# Altium footprint library LIBRARIE_EMILE.PcbLib: 35 footprints (part 1 of 3)
Each footprint in its own frame and in the unit in brackets; x right, y up, seen from the top. Pads: shape width x height; smd on the part's side, far side on the other; paste and mask are expansions set on the pad; w line width, h text height; cw(c..) or ccw(c..) is an arc to the next point about the centre after c.
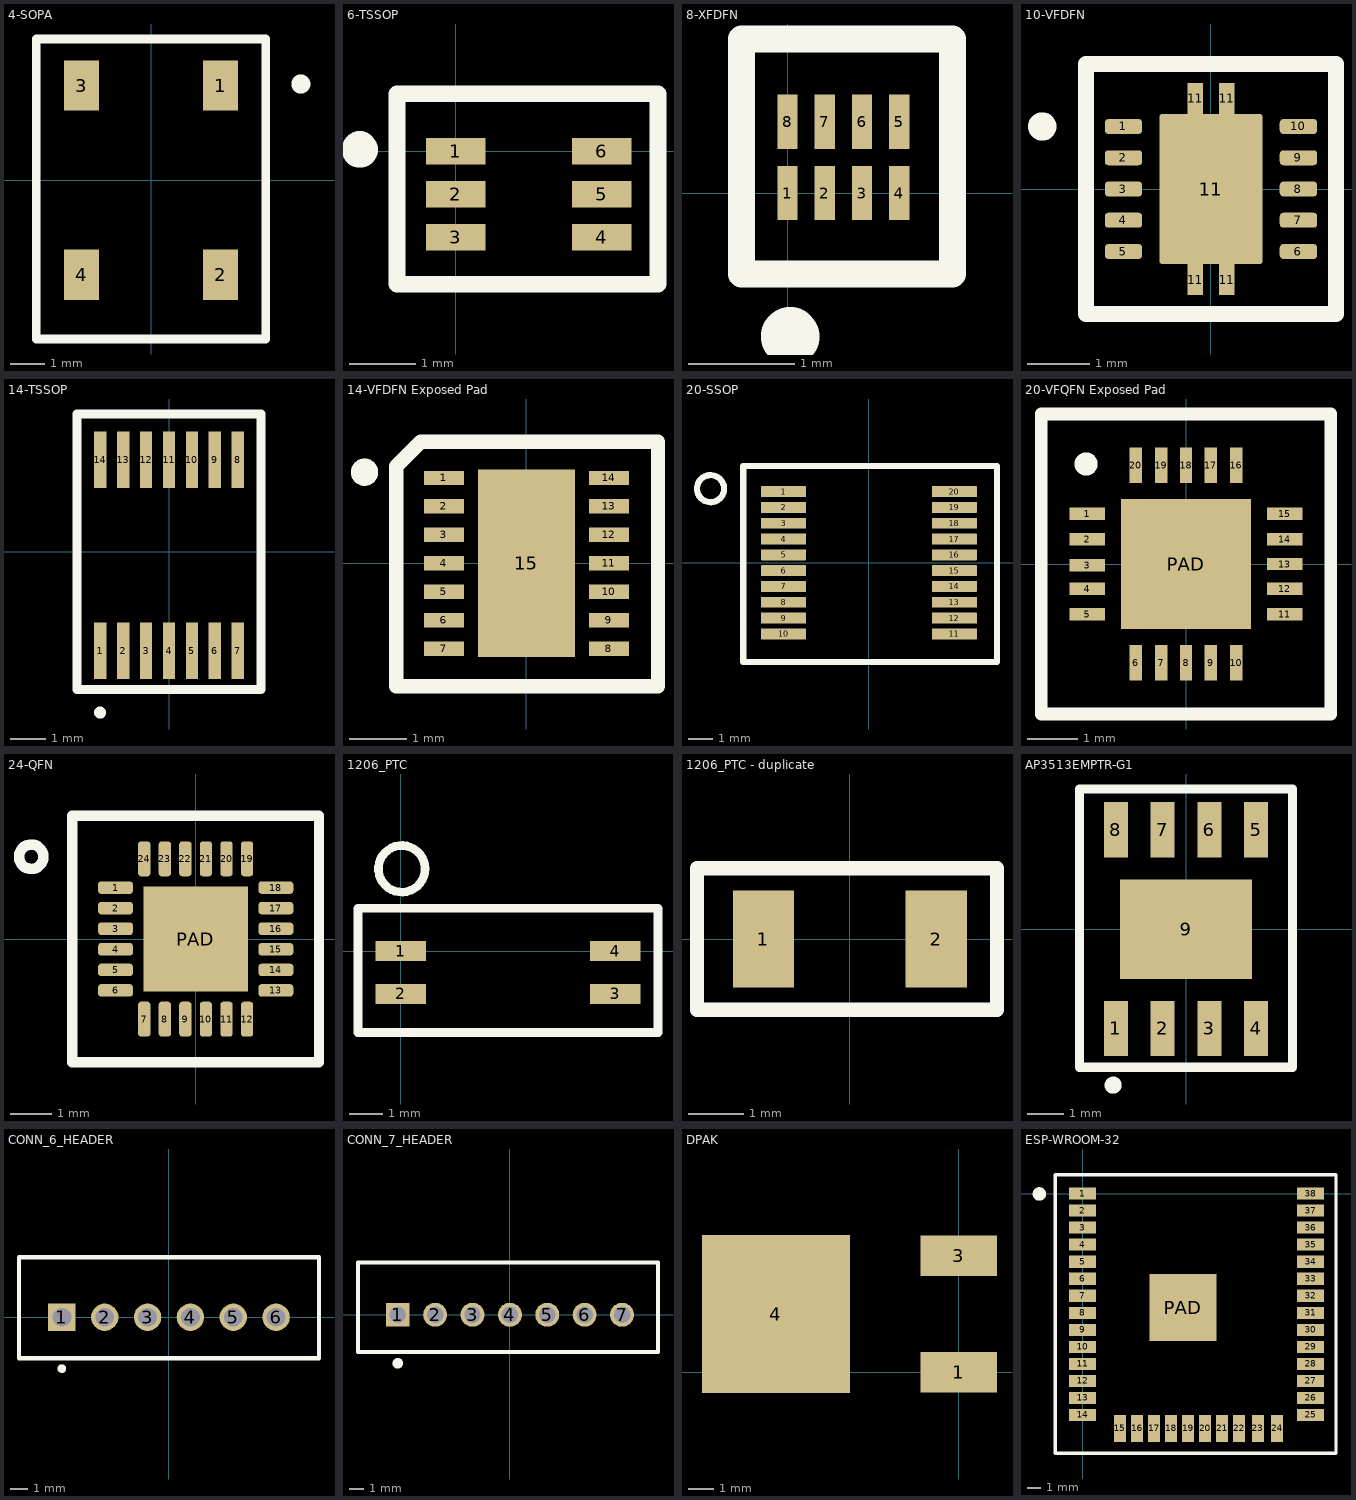
[diagram p0: the footprints below, top view; thin cyan lines are the x and y axes]

## 4-SOPA [mm]
pads (4):
  rect 1x1.45 smd: 1(2,2.725) 2(2,-2.725) 3(-2,2.725) 4(-2,-2.725)
Top Overlay:
  lines w0.254: -3.302,-4.572 3.302,-4.572 3.302,4.064 -3.302,4.064 -3.302,-4.572
  lines w0.5: 4.329,2.788 ccw(c4.312,2.77) 4.337,2.77
3D body "User Library-SOP-4.step": height 1.02, standoff -1.02, extent -2,-3.43 2,3.43

## 6-TSSOP [mm]
pads (6):
  rect 0.9x0.4 smd paste-0.025 mask+0.05: 1(0,0) 2(0,-0.65) 3(0,-1.3) 4(2.2,-1.3) 5(2.2,-0.65) 6(2.2,0)
Top Overlay:
  lines w0.254: -0.889,-2.007 -0.889,0.864 3.048,0.864 3.048,-2.007 -0.889,-2.007
  lines w0.5: -1.444,0.049 ccw(c-1.45,0.025) -1.425,0.025
3D body "6-TSSOP.step": height 1.1, standoff 0, extent -0.033,-1.635 2.167,0.365

## 8-XFDFN [mm]
pads (8):
  rect 0.19x0.508 smd paste-0.025 mask+0.05: 1(0,0) 2(0.35,0) 3(0.7,0) 4(1.05,0) 5(1.05,0.67) 6(0.7,0.67) 7(0.35,0.67) 8(0,0.67)
Top Overlay:
  lines w0.254: -0.432,-0.762 1.549,-0.762 1.549,1.448 -0.432,1.448 -0.432,-0.762
  lines w0.5: 0.032,-1.322 ccw(c0.025,-1.346) 0.05,-1.346
3D body "DQE8.step": height 0.13, standoff 0, extent -0.19,-0.242 1.258,0.902

## 10-VFDFN [mm]
pads (15):
  rrect50% 0.6x0.24 smd paste-0.025 mask+0.05: 1(-1.4,1) 2(-1.4,0.5) 3(-1.4,0) 4(-1.4,-0.5) 5(-1.4,-1) 6(1.4,-1) 7(1.4,-0.5) 8(1.4,0) 9(1.4,0.5) 10(1.4,1)
  rrect5% 0.25x0.5 smd paste-0.025 mask+0.05: 11(-0.25,-1.45) 11(-0.25,1.45) 11(0.25,-1.45) 11(0.25,1.45)
  rrect5% 1.65x2.4 smd paste-0.025 mask+0.05: 11(0,0)
Top Overlay:
  circle w0.254: c-2.7,1 r0.1
  lines w0.254: -2,-2 -2,2 2,2 2,-2 -2,-2
3D body "10-VFDFN.step": height 1, standoff 0, extent -1.56,-1.562 1.56,1.562

## 14-TSSOP [mm]
pads (14):
  rect 0.35x1.6 smd paste+0 mask+0.05: 1(-1.95,-2.8) 2(-1.3,-2.8) 3(-0.65,-2.8) 4(0,-2.8) 5(0.65,-2.8) 6(1.3,-2.8) 7(1.95,-2.8) 8(1.95,2.6) 9(1.3,2.6) 10(0.65,2.6) 11(0,2.6) 12(-0.65,2.6) 13(-1.3,2.6) 14(-1.95,2.6)
Top Overlay:
  circle w0.254: c-1.95,-4.55 r0.041
  lines w0.254: -2.6,-3.9 2.6,-3.9 2.6,3.9 -2.6,3.9 -2.6,-3.9
3D body "User Library-tssop14-2.step": height 1.2, standoff 0, extent -2.55,-3.2 2.55,3.2

## 14-VFDFN Exposed Pad [mm]
pads (15):
  rect 0.7x0.25 smd paste-0.025 mask+0.07: 1(-1.45,1.5) 2(-1.45,1) 3(-1.45,0.5) 4(-1.45,0) 5(-1.45,-0.5) 6(-1.45,-1) 7(-1.45,-1.5) 8(1.45,-1.5) 9(1.45,-1) 10(1.45,-0.5) 11(1.45,0) 12(1.45,0.5) 13(1.45,1) 14(1.45,1.5)
  rect 1.7x3.3 smd paste-0.025 mask+0.07: 15(0,0)
Top Overlay:
  circle w0.254: c-2.845,1.6 r0.114
  lines w0.254: -2.286,-2.159 -2.286,1.702 -1.854,2.134 2.311,2.134 2.311,-2.159 -2.286,-2.159
3D body "DFN-14-1EP_3x4mm_P0.5mm_EP1.7x3.3mm.step": height 0.77, standoff 0, extent -1.5,-1.99 1.5,1.99

## 20-SSOP [mm]
pads (20):
  rrect10% 1.85x0.45 smd paste-0.025 mask+0.05: 1(-3.5,2.925) 2(-3.5,2.275) 3(-3.5,1.625) 4(-3.5,0.975) 5(-3.5,0.325) 6(-3.5,-0.325) 7(-3.5,-0.975) 8(-3.5,-1.625) 9(-3.5,-2.275) 10(-3.5,-2.925) 11(3.53,-2.925) 12(3.53,-2.275) 13(3.53,-1.625) 14(3.53,-0.975) 15(3.53,-0.325) 16(3.53,0.325) 17(3.53,0.975) 18(3.53,1.625) 19(3.53,2.275) 20(3.53,2.925)
Top Overlay:
  circle w0.254: c-6.502,3.048 r0.557
  lines w0.254: -5.156,-4.089 -5.156,3.988 5.283,3.988 5.283,-4.089 -3.531,-4.089 -5.156,-4.089
3D body "User Library-SSOP_20.step": height 1.79, standoff -0.05, extent -3.925,-3.65 3.975,3.65

## 20-VFQFN Exposed Pad [mm] "POE_REG"
pads (21):
  rect 0.7x0.25 smd paste-0.025 mask+0.07: 1(-1.975,1) 2(-1.975,0.5) 3(-1.975,-0.025) 4(-1.975,-0.5) 5(-1.975,-1) 11(1.975,-1) 12(1.975,-0.5) 13(1.975,0) 14(1.975,0.5) 15(1.975,1)
  rect 0.25x0.7 smd paste-0.025 mask+0.07: 6(-1,-1.975) 7(-0.5,-1.975) 8(0,-1.975) 9(0.5,-1.975) 10(1,-1.975) 16(1,1.975) 17(0.5,1.975) 18(0,1.975) 19(-0.5,1.975) 20(-1,1.975)
  rect 2.6x2.6 smd paste-0.025 mask+0.07: PAD(0,0)
Top Overlay:
  circle w0.254: c-2,2 r0.105
  lines w0.254: -2.896,-3 -2.896,3 2.896,3 2.896,-3 -2.896,-3
3D body "User Library-QFN20 4x4.step": height 0.72, standoff -0.01, extent -2.025,-2.025 2.025,2.025

## 24-QFN [mm]
pads (25):
  rrect50% 0.85x0.3 smd paste-0.025 mask+0.05: 1(-1.95,1.25) 2(-1.95,0.75) 3(-1.95,0.25) 4(-1.95,-0.25) 5(-1.95,-0.75) 6(-1.95,-1.25)
  rrect50% 0.3x0.85 smd mask+0.05: 7(-1.25,-1.95) 8(-0.75,-1.95) 9(-0.25,-1.95) 10(0.25,-1.95) 11(0.75,-1.95) 12(1.25,-1.95) 19(1.25,1.95) 20(0.75,1.95) 21(0.25,1.95) 22(-0.25,1.95) 23(-0.75,1.95) 24(-1.25,1.95)
  rrect50% 0.85x0.3 smd mask+0.05: 13(1.95,-1.25) 14(1.95,-0.75) 15(1.95,-0.25) 16(1.95,0.25) 17(1.95,0.75) 18(1.95,1.25)
  rect 2.55x2.55 smd mask+0.07: PAD(0,0)
Top Overlay:
  circle w0.254: c-4,2 r0.297
  lines w0.254: -3,-3 3,-3 3,3 -3,3 -3,-3
3D body "User Library-QFN 24 4x4.step": height 0.9, standoff 0, extent -2.004,-2 2,2.004

## 1206_PTC [mm]
pads (4):
  rect 1.5x0.6 smd paste+0.025 mask+0.07: 1(0,0) 2(0,-1.27) 3(6.35,-1.27) 4(6.35,0)
Top Overlay:
  circle w0.254: c0.025,2.438 r0.691
  lines w0.254: -1.27,-2.413 7.62,-2.413 7.62,1.27 -1.27,1.27 -1.27,-2.413
3D body "User Library-ACPL-217-56DE.step": height 2.01, standoff -0.12, extent -0.325,-1.956 6.675,0.644

## 1206_PTC - duplicate [mm]
pads (2):
  rect 1.1x1.75 smd paste+0.025 mask+0.07: 1(-1.55,0) 2(1.55,0)
Top Overlay:
  lines w0.254: -2.743,-1.27 2.642,-1.27 2.642,1.27 -2.743,1.27 -2.743,-1.27
3D body "User Library-nona SMD075F.step": height 0.56, standoff 0, extent -1.525,-0.8 1.677,0.852

## AP3513EMPTR-G1 [mm] "SW REG"
pads (9):
  rect 0.65x1.5 smd paste-0.025 mask+0.07: 1(-1.905,-2.7) 2(-0.635,-2.7) 3(0.635,-2.7) 4(1.905,-2.7) 5(1.905,2.7) 6(0.635,2.7) 7(-0.635,2.7) 8(-1.905,2.7)
  rect 3.6x2.7 smd paste-0.025 mask+0.07: 9(0,0)
Top Overlay:
  circle w0.254: c-1.981,-4.242 r0.105
  lines w0.254: -2.896,-3.759 2.896,-3.759 2.896,3.81 -2.896,3.81 -2.896,-3.759
3D body "SO-8.step": height 1.7, standoff 0, extent -2.45,-3 2.45,3

## CONN_6_HEADER [mm]
pads (6):
  rect 1.6x1.6 hole 1.1: 1(-6.25,0)
  round 1.6 hole 1.1: 2(-3.75,0) 3(-1.25,0) 4(1.25,0) 5(3.75,0) 6(6.25,0)
Top Overlay:
  circle w0.254: c-6.25,-3 r0.127
  lines w0.254: -8.75,-2.388 8.751,-2.388 8.751,3.5 -8.75,3.5 -8.75,-2.388
3D body "User Library-jst-b6b-xh-a.step": height 7, standoff -3.4, extent -8.649,-2.388 8.751,3.362

## CONN_7_HEADER [mm]
pads (7):
  rect 1.6x1.6 hole 1.1 mask+0.07: 1(-7.5,0)
  round 1.6 hole 1.1 mask+0.07: 2(-5,0) 3(-2.5,0) 4(0,0) 5(2.5,0) 6(5,0) 7(7.5,0)
Top Overlay:
  circle w0.4: c-7.5,-3.25 r0.152
  lines w0.254: -10.16,-2.5 -10.16,3.5 9.906,3.5 9.906,-2.5 -10.16,-2.5
3D body "User Library-B7B-XH-A.step": height 7, standoff -3.4, extent -9.994,-2.392 9.906,3.358

## DPAK [mm]
pads (3):
  rect 3x1.6 smd paste-0.025 mask+0.05: 1(0,0) 3(0,4.57)
  rect 5.8x6.2 smd paste-0.025 mask+0.05: 4(-7.18,2.285)
3D body "User Library-TO-252-3.step": height 2.41, standoff 0, extent -9.65,-1.05 0.702,5.65

## ESP-WROOM-32 [mm]
pads (39):
  rect 2x0.9 smd paste-0.025 mask+0.07: 1(0,0) 2(0,-1.27) 3(0,-2.54) 4(0,-3.81) 5(0,-5.08) 6(0,-6.35) 7(0,-7.62) 8(0,-8.89) 9(0,-10.16) 10(0,-11.43) 11(0,-12.7) 12(0,-13.97) 13(0,-15.24) 14(0,-16.51) 25(17,-16.51) 26(17,-15.24) 27(17,-13.97) 28(17,-12.7) 29(17,-11.43) 30(17,-10.16) 31(17,-8.89) 32(17,-7.62) 33(17,-6.35) 34(17,-5.08) 35(17,-3.81) 36(17,-2.54) 37(17,-1.27) 38(17,0)
  rect 0.9x2 smd paste-0.025 mask+0.07: 15(2.785,-17.51) 16(4.055,-17.51) 17(5.325,-17.51) 18(6.595,-17.51) 19(7.865,-17.51) 20(9.135,-17.51) 21(10.405,-17.51) 22(11.675,-17.51) 23(13.072,-17.51) 24(14.503,-17.51)
  rect 5x5 smd paste-0.025 mask+0.07: PAD(7.5,-8.5)
Top Overlay:
  circle w0.5: c-3.226,-0.025 r0.254
  lines w0.254: -2.032,-19.38 18.898,-19.38 18.898,1.422 -2.032,1.422 -2.032,-19.38
3D body "User Library-esp-wroom-32.step": height 3, standoff -0.04, extent -0.568,-18.023 17.502,7.517